# Altium footprint library Molex FFC - FPC Connectors (SMT).PcbLib: 638 footprints (part 5 of 40)
Each footprint in its own frame and in the unit in brackets; x right, y up, seen from the top. Pads: shape width x height; smd on the part's side, far side on the other; paste and mask are expansions set on the pad; w line width, h text height; cw(c..) or ccw(c..) is an arc to the next point about the centre after c.
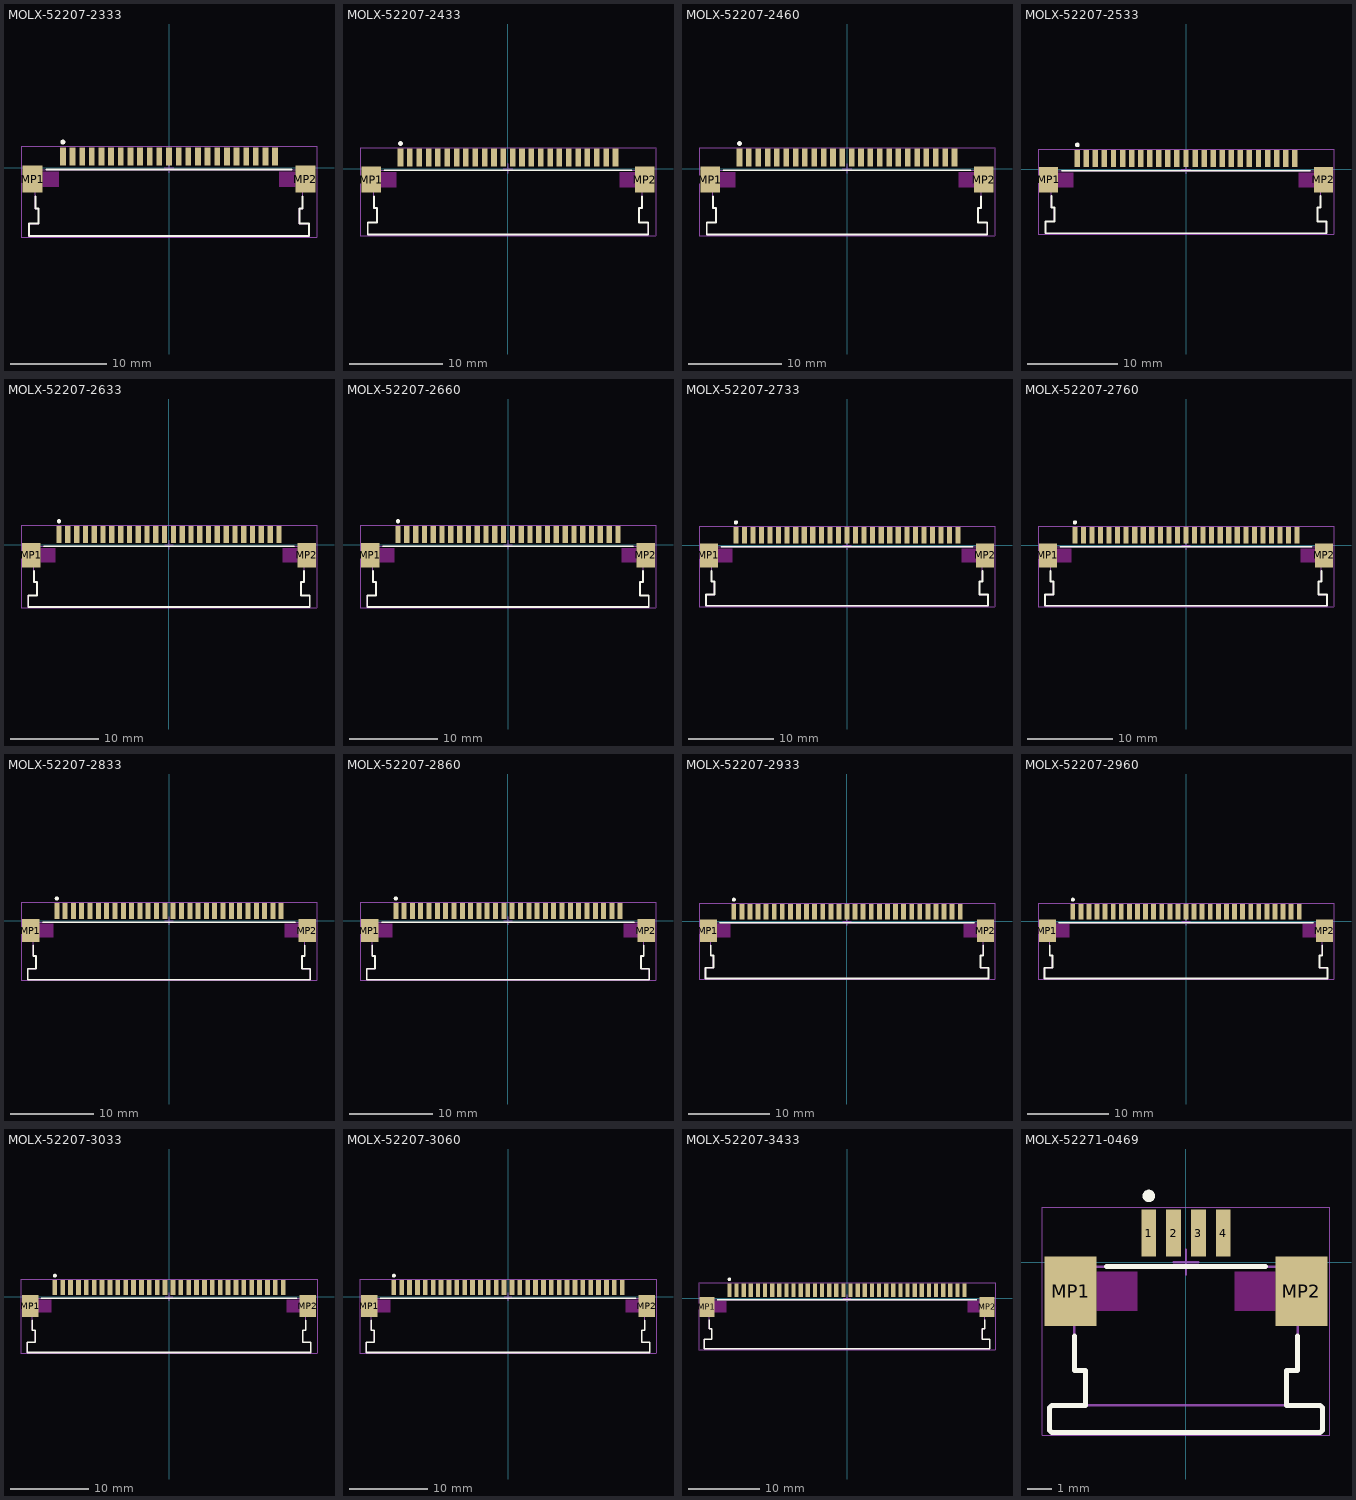
[diagram p4: the footprints below, top view; thin cyan lines are the x and y axes]

## MOLX-52207-2333 [mm] "FPC Connector, 23-Leads, Right Angle, Pitch 1.0 mm, Mated Height 2.7 mm, SMT"
height 2.712
pads (25):
  rect 0.6x1.9 smd: 1(-11,1.175) 2(-10,1.175) 3(-9,1.175) 4(-8,1.175) 5(-7,1.175) 6(-6,1.175) 7(-5,1.175) 8(-4,1.175) 9(-3,1.175) 10(-2,1.175) 11(-1,1.175) 12(0,1.175) 13(1,1.175) 14(2,1.175) 15(3,1.175) 16(4,1.175) 17(5,1.175) 18(6,1.175) 19(7,1.175) 20(8,1.175) 21(9,1.175) 22(10,1.175) 23(11,1.175)
  rect 2.1x2.8 smd: MP1(-14.15,-1.175) MP2(14.15,-1.175)
Top Overlay:
  circle w0.25: c-11,2.675 r0.125
  lines w0.2: -13.85,-2.975 -13.85,-4.225 -13.513,-4.225 -13.512,-5.765 -14.5,-5.765 -14.5,-7.075 14.5,-7.075 14.5,-5.765 13.512,-5.765 13.512,-4.225 13.85,-4.225 13.85,-2.975 ; -12.7,-0.175 12.7,-0.175
Keep-Out Layer:
  region: -13.1,-0.375 -11.45,-0.375 -11.45,-1.975 -13.1,-1.975
  region: 13.1,-0.375 11.45,-0.375 11.45,-1.975 13.1,-1.975
Mechanical 13:
  lines w0.1: -13.85,-2.175 -14.65,-2.175 -14.65,-0.175 14.65,-0.175 14.65,-2.175 13.85,-2.175 ; -13.85,-2.175 -13.85,-4.225 -13.512,-4.225 -13.512,-5.765 -14.5,-5.765 -14.5,-7.075 14.5,-7.075 14.5,-5.765 13.512,-5.765 13.512,-4.225 13.85,-4.225 13.85,-2.175
Mechanical 15:
  lines w0.05: -15.3,-7.175 -15.3,2.225 15.3,2.225 15.3,-7.175 -15.3,-7.175
  lines w0.1: -0.5,0 0.5,0 ; 0,-0.5 0,0.5
3D body: height 0.25, standoff 0, extent -14.65,-7.075 14.65,1.825

## MOLX-52207-2433 [mm] "FPC Connector, 24-Leads, Right Angle, Pitch 1.0 mm, Mated Height 2.7 mm, SMT"
height 2.712
pads (26):
  rect 0.6x1.9 smd: 1(-11.5,1.175) 2(-10.5,1.175) 3(-9.5,1.175) 4(-8.5,1.175) 5(-7.5,1.175) 6(-6.5,1.175) 7(-5.5,1.175) 8(-4.5,1.175) 9(-3.5,1.175) 10(-2.5,1.175) 11(-1.5,1.175) 12(-0.5,1.175) 13(0.5,1.175) 14(1.5,1.175) 15(2.5,1.175) 16(3.5,1.175) 17(4.5,1.175) 18(5.5,1.175) 19(6.5,1.175) 20(7.5,1.175) 21(8.5,1.175) 22(9.5,1.175) 23(10.5,1.175) 24(11.5,1.175)
  rect 2.1x2.8 smd: MP1(-14.65,-1.175) MP2(14.65,-1.175)
Top Overlay:
  circle w0.25: c-11.5,2.675 r0.125
  lines w0.2: -14.35,-2.975 -14.35,-4.225 -14.012,-4.225 -14.012,-5.765 -15,-5.765 -15,-7.075 15,-7.075 15,-5.765 14.012,-5.765 14.012,-4.225 14.35,-4.225 14.35,-2.975 ; -13.2,-0.175 13.2,-0.175
Keep-Out Layer:
  region: 13.6,-0.375 11.95,-0.375 11.95,-1.975 13.6,-1.975
  region: -13.6,-0.375 -11.95,-0.375 -11.95,-1.975 -13.6,-1.975
Mechanical 13:
  lines w0.1: -15.15,-2.175 -14.35,-2.175 -14.35,-4.225 -14.012,-4.225 -14.012,-5.765 -15,-5.765 -15,-7.075 15,-7.075 15,-5.765 14.012,-5.765 14.012,-4.225 14.35,-4.225 14.35,-2.175 15.15,-2.175 15.15,-0.175 -15.15,-0.175 -15.15,-2.175
Mechanical 15:
  lines w0.05: -15.8,-7.175 15.8,-7.175 15.8,2.225 -15.8,2.225 -15.8,-7.175
  lines w0.1: -0.5,0 0.5,0 ; 0,-0.5 0,0.5
3D body: height 0.25, standoff 0, extent -15.15,-7.075 15.15,1.825

## MOLX-52207-2460 [mm] "FPC Connector, 24-Leads, Right Angle, Pitch 1.0 mm, Mated Height 2.7 mm, SMT"
height 2.712
pads (26):
  rect 0.6x1.9 smd: 1(-11.5,1.175) 2(-10.5,1.175) 3(-9.5,1.175) 4(-8.5,1.175) 5(-7.5,1.175) 6(-6.5,1.175) 7(-5.5,1.175) 8(-4.5,1.175) 9(-3.5,1.175) 10(-2.5,1.175) 11(-1.5,1.175) 12(-0.5,1.175) 13(0.5,1.175) 14(1.5,1.175) 15(2.5,1.175) 16(3.5,1.175) 17(4.5,1.175) 18(5.5,1.175) 19(6.5,1.175) 20(7.5,1.175) 21(8.5,1.175) 22(9.5,1.175) 23(10.5,1.175) 24(11.5,1.175)
  rect 2.1x2.8 smd: MP1(-14.65,-1.175) MP2(14.65,-1.175)
Top Overlay:
  circle w0.25: c-11.5,2.675 r0.125
  lines w0.2: -14.35,-2.975 -14.35,-4.225 -14.013,-4.225 ; -14.012,-4.225 -14.012,-5.765 -15,-5.765 -15,-7.075 15,-7.075 15,-5.765 14.012,-5.765 14.012,-4.225 ; -13.2,-0.175 13.2,-0.175 ; 14.013,-4.225 14.35,-4.225 14.35,-2.975
Keep-Out Layer:
  region: 13.6,-0.375 11.95,-0.375 11.95,-1.975 13.6,-1.975
  region: -13.6,-0.375 -11.95,-0.375 -11.95,-1.975 -13.6,-1.975
Mechanical 13:
  lines w0.1: -15.15,-2.175 -14.35,-2.175 -14.35,-4.225 -14.012,-4.225 -14.012,-5.765 -15,-5.765 -15,-7.075 15,-7.075 15,-5.765 14.012,-5.765 14.012,-4.225 14.35,-4.225 14.35,-2.175 15.15,-2.175 15.15,-0.175 -15.15,-0.175 -15.15,-2.175
Mechanical 15:
  lines w0.05: -15.8,-7.175 15.8,-7.175 15.8,2.225 -15.8,2.225 -15.8,-7.175
  lines w0.1: -0.5,0 0.5,0 ; 0,-0.5 0,0.5
3D body: height 0.25, standoff 0, extent -15.15,-7.075 15.15,1.825

## MOLX-52207-2533 [mm] "FPC Connector, 25-Leads, Right Angle, Pitch 1.0 mm, Mated Height 2.7 mm, SMT"
height 2.712
pads (27):
  rect 0.6x1.9 smd: 1(-12,1.175) 2(-11,1.175) 3(-10,1.175) 4(-9,1.175) 5(-8,1.175) 6(-7,1.175) 7(-6,1.175) 8(-5,1.175) 9(-4,1.175) 10(-3,1.175) 11(-2,1.175) 12(-1,1.175) 13(0,1.175) 14(1,1.175) 15(2,1.175) 16(3,1.175) 17(4,1.175) 18(5,1.175) 19(6,1.175) 20(7,1.175) 21(8,1.175) 22(9,1.175) 23(10,1.175) 24(11,1.175) 25(12,1.175)
  rect 2.1x2.8 smd: MP1(-15.15,-1.175) MP2(15.15,-1.175)
Top Overlay:
  circle w0.25: c-12,2.675 r0.125
  lines w0.2: -14.85,-2.975 -14.85,-4.225 -14.512,-4.225 -14.512,-5.765 -15.5,-5.765 -15.5,-7.075 15.5,-7.075 15.5,-5.765 14.512,-5.765 14.512,-4.225 14.85,-4.225 14.85,-2.975 ; -13.7,-0.175 13.7,-0.175
Keep-Out Layer:
  region: 14.1,-0.375 12.45,-0.375 12.45,-1.975 14.1,-1.975
  region: -14.1,-0.375 -12.45,-0.375 -12.45,-1.975 -14.1,-1.975
Mechanical 13:
  lines w0.1: -15.65,-2.175 -14.85,-2.175 -14.85,-4.225 -14.512,-4.225 -14.512,-5.765 -15.5,-5.765 -15.5,-7.075 15.5,-7.075 15.5,-5.765 14.512,-5.765 14.512,-4.225 14.85,-4.225 14.85,-2.175 15.65,-2.175 15.65,-0.175 -15.65,-0.175 -15.65,-2.175
Mechanical 15:
  lines w0.05: -16.3,-7.175 16.3,-7.175 16.3,2.225 -16.3,2.225 -16.3,-7.175
  lines w0.1: -0.5,0 0.5,0 ; 0,-0.5 0,0.5
3D body: height 0.25, standoff 0, extent -15.65,-7.075 15.65,1.825

## MOLX-52207-2633 [mm] "FPC Connector, 26-Leads, Right Angle, Pitch 1.0 mm, Mated Height 2.7 mm, SMT"
height 2.712
pads (28):
  rect 0.6x1.9 smd: 1(-12.5,1.175) 2(-11.5,1.175) 3(-10.5,1.175) 4(-9.5,1.175) 5(-8.5,1.175) 6(-7.5,1.175) 7(-6.5,1.175) 8(-5.5,1.175) 9(-4.5,1.175) 10(-3.5,1.175) 11(-2.5,1.175) 12(-1.5,1.175) 13(-0.5,1.175) 14(0.5,1.175) 15(1.5,1.175) 16(2.5,1.175) 17(3.5,1.175) 18(4.5,1.175) 19(5.5,1.175) 20(6.5,1.175) 21(7.5,1.175) 22(8.5,1.175) 23(9.5,1.175) 24(10.5,1.175) 25(11.5,1.175) 26(12.5,1.175)
  rect 2.1x2.8 smd: MP1(-15.65,-1.175) MP2(15.65,-1.175)
Top Overlay:
  circle w0.25: c-12.5,2.675 r0.125
  lines w0.2: -15.35,-2.975 -15.35,-4.225 -15.012,-4.225 ; -15.012,-4.225 -15.012,-5.765 -16,-5.765 -16,-7.075 16,-7.075 16,-5.765 15.012,-5.765 15.012,-4.225 ; -14.2,-0.175 14.2,-0.175 ; 15.012,-4.225 15.35,-4.225 15.35,-2.975
Keep-Out Layer:
  region: 14.6,-0.375 12.95,-0.375 12.95,-1.975 14.6,-1.975
  region: -14.6,-0.375 -12.95,-0.375 -12.95,-1.975 -14.6,-1.975
Mechanical 13:
  lines w0.1: -16.15,-2.175 -15.35,-2.175 -15.35,-4.225 -15.012,-4.225 -15.012,-5.765 -16,-5.765 -16,-7.075 16,-7.075 16,-5.765 15.012,-5.765 15.012,-4.225 15.35,-4.225 15.35,-2.175 16.15,-2.175 16.15,-0.175 -16.15,-0.175 -16.15,-2.175
Mechanical 15:
  lines w0.05: -16.8,-7.175 16.8,-7.175 16.8,2.225 -16.8,2.225 -16.8,-7.175
  lines w0.1: -0.5,0 0.5,0 ; 0,-0.5 0,0.5
3D body: height 0.25, standoff 0, extent -16.15,-7.075 16.15,1.825

## MOLX-52207-2660 [mm] "FPC Connector, 26-Leads, Right Angle, Pitch 1.0 mm, Mated Height 2.7 mm, SMT"
height 2.712
pads (28):
  rect 0.6x1.9 smd: 1(-12.5,1.175) 2(-11.5,1.175) 3(-10.5,1.175) 4(-9.5,1.175) 5(-8.5,1.175) 6(-7.5,1.175) 7(-6.5,1.175) 8(-5.5,1.175) 9(-4.5,1.175) 10(-3.5,1.175) 11(-2.5,1.175) 12(-1.5,1.175) 13(-0.5,1.175) 14(0.5,1.175) 15(1.5,1.175) 16(2.5,1.175) 17(3.5,1.175) 18(4.5,1.175) 19(5.5,1.175) 20(6.5,1.175) 21(7.5,1.175) 22(8.5,1.175) 23(9.5,1.175) 24(10.5,1.175) 25(11.5,1.175) 26(12.5,1.175)
  rect 2.1x2.8 smd: MP1(-15.65,-1.175) MP2(15.65,-1.175)
Top Overlay:
  circle w0.25: c-12.5,2.675 r0.125
  lines w0.2: -15.35,-2.975 -15.35,-4.225 -15.013,-4.225 -15.012,-5.765 -16,-5.765 -16,-7.075 16,-7.075 16,-5.765 15.012,-5.765 15.012,-4.225 15.35,-4.225 15.35,-2.975 ; -14.2,-0.175 14.2,-0.175
Keep-Out Layer:
  region: 14.6,-0.375 12.95,-0.375 12.95,-1.975 14.6,-1.975
  region: -14.6,-0.375 -12.95,-0.375 -12.95,-1.975 -14.6,-1.975
Mechanical 13:
  lines w0.1: -16.15,-2.175 -15.35,-2.175 -15.35,-4.225 -15.012,-4.225 -15.012,-5.765 -16,-5.765 -16,-7.075 16,-7.075 16,-5.765 15.012,-5.765 15.012,-4.225 15.35,-4.225 15.35,-2.175 16.15,-2.175 16.15,-0.175 -16.15,-0.175 -16.15,-2.175
Mechanical 15:
  lines w0.05: -16.8,-7.175 16.8,-7.175 16.8,2.225 -16.8,2.225 -16.8,-7.175
  lines w0.1: -0.5,0 0.5,0 ; 0,-0.5 0,0.5
3D body: height 0.25, standoff 0, extent -16.15,-7.075 16.15,1.825

## MOLX-52207-2733 [mm] "FPC Connector, 27-Leads, Right Angle, Pitch 1.0 mm, Mated Height 2.7 mm, SMT"
height 2.712
pads (29):
  rect 0.6x1.9 smd: 1(-13,1.175) 2(-12,1.175) 3(-11,1.175) 4(-10,1.175) 5(-9,1.175) 6(-8,1.175) 7(-7,1.175) 8(-6,1.175) 9(-5,1.175) 10(-4,1.175) 11(-3,1.175) 12(-2,1.175) 13(-1,1.175) 14(0,1.175) 15(1,1.175) 16(2,1.175) 17(3,1.175) 18(4,1.175) 19(5,1.175) 20(6,1.175) 21(7,1.175) 22(8,1.175) 23(9,1.175) 24(10,1.175) 25(11,1.175) 26(12,1.175) 27(13,1.175)
  rect 2.1x2.8 smd: MP1(-16.15,-1.175) MP2(16.15,-1.175)
Top Overlay:
  circle w0.25: c-13,2.675 r0.125
  lines w0.2: -15.85,-2.975 -15.85,-4.225 -15.513,-4.225 ; -15.512,-4.225 -15.512,-5.765 -16.5,-5.765 -16.5,-7.075 16.5,-7.075 16.5,-5.765 15.512,-5.765 15.512,-4.225 ; -14.7,-0.175 14.7,-0.175 ; 15.513,-4.225 15.85,-4.225 15.85,-2.975
Keep-Out Layer:
  region: -15.1,-0.375 -13.45,-0.375 -13.45,-1.975 -15.1,-1.975
  region: 15.1,-0.375 13.45,-0.375 13.45,-1.975 15.1,-1.975
Mechanical 13:
  lines w0.1: -15.512,-4.225 -15.85,-4.225 -15.85,-2.175 -16.65,-2.175 -16.65,-0.175 16.65,-0.175 16.65,-2.175 15.85,-2.175 15.85,-4.225 15.512,-4.225 ; -15.512,-4.225 -15.512,-5.765 -16.5,-5.765 -16.5,-7.075 16.5,-7.075 16.5,-5.765 15.512,-5.765 15.512,-4.225
Mechanical 15:
  lines w0.05: -17.3,-7.175 -17.3,2.225 17.3,2.225 17.3,-7.175 -17.3,-7.175
  lines w0.1: -0.5,0 0.5,0 ; 0,-0.5 0,0.5
3D body: height 0.25, standoff 0, extent -16.65,-7.075 16.65,1.825

## MOLX-52207-2760 [mm] "FPC Connector, 27-Leads, Right Angle, Pitch 1.0 mm, Mated Height 2.7 mm, SMT"
height 2.712
pads (29):
  rect 0.6x1.9 smd: 1(-13,1.175) 2(-12,1.175) 3(-11,1.175) 4(-10,1.175) 5(-9,1.175) 6(-8,1.175) 7(-7,1.175) 8(-6,1.175) 9(-5,1.175) 10(-4,1.175) 11(-3,1.175) 12(-2,1.175) 13(-1,1.175) 14(0,1.175) 15(1,1.175) 16(2,1.175) 17(3,1.175) 18(4,1.175) 19(5,1.175) 20(6,1.175) 21(7,1.175) 22(8,1.175) 23(9,1.175) 24(10,1.175) 25(11,1.175) 26(12,1.175) 27(13,1.175)
  rect 2.1x2.8 smd: MP1(-16.15,-1.175) MP2(16.15,-1.175)
Top Overlay:
  circle w0.25: c-13,2.675 r0.125
  lines w0.2: -15.85,-2.975 -15.85,-4.225 -15.513,-4.225 ; -15.512,-4.225 -15.512,-5.765 -16.5,-5.765 -16.5,-7.075 16.5,-7.075 16.5,-5.765 15.512,-5.765 15.512,-4.225 ; -14.7,-0.175 14.7,-0.175 ; 15.513,-4.225 15.85,-4.225 15.85,-2.975
Keep-Out Layer:
  region: 15.1,-0.375 13.45,-0.375 13.45,-1.975 15.1,-1.975
  region: -15.1,-0.375 -13.45,-0.375 -13.45,-1.975 -15.1,-1.975
Mechanical 13:
  lines w0.1: -15.512,-4.225 -15.85,-4.225 -15.85,-2.175 -16.65,-2.175 -16.65,-0.175 16.65,-0.175 16.65,-2.175 15.85,-2.175 15.85,-4.225 15.512,-4.225 ; -15.512,-4.225 -15.512,-5.765 -16.5,-5.765 -16.5,-7.075 16.5,-7.075 16.5,-5.765 15.512,-5.765 15.512,-4.225
Mechanical 15:
  lines w0.05: -17.3,-7.175 17.3,-7.175 17.3,2.225 -17.3,2.225 -17.3,-7.175
  lines w0.1: -0.5,0 0.5,0 ; 0,-0.5 0,0.5
3D body: height 0.25, standoff 0, extent -16.65,-7.075 16.65,1.825

## MOLX-52207-2833 [mm] "FPC Connector, 28-Leads, Right Angle, Pitch 1.0 mm, Mated Height 2.7 mm, SMT"
height 2.712
pads (30):
  rect 0.6x1.9 smd: 1(-13.5,1.175) 2(-12.5,1.175) 3(-11.5,1.175) 4(-10.5,1.175) 5(-9.5,1.175) 6(-8.5,1.175) 7(-7.5,1.175) 8(-6.5,1.175) 9(-5.5,1.175) 10(-4.5,1.175) 11(-3.5,1.175) 12(-2.5,1.175) 13(-1.5,1.175) 14(-0.5,1.175) 15(0.5,1.175) 16(1.5,1.175) 17(2.5,1.175) 18(3.5,1.175) 19(4.5,1.175) 20(5.5,1.175) 21(6.5,1.175) 22(7.5,1.175) 23(8.5,1.175) 24(9.5,1.175) 25(10.5,1.175) 26(11.5,1.175) 27(12.5,1.175) 28(13.5,1.175)
  rect 2.1x2.8 smd: MP1(-16.65,-1.175) MP2(16.65,-1.175)
Top Overlay:
  circle w0.25: c-13.5,2.675 r0.125
  lines w0.2: -16.35,-2.975 -16.35,-4.225 -16.013,-4.225 -16.012,-5.765 -17,-5.765 -17,-7.075 17,-7.075 17,-5.765 16.012,-5.765 16.012,-4.225 16.35,-4.225 16.35,-2.975 ; -15.2,-0.175 15.2,-0.175
Keep-Out Layer:
  region: -15.6,-0.375 -13.95,-0.375 -13.95,-1.975 -15.6,-1.975
  region: 15.6,-0.375 13.95,-0.375 13.95,-1.975 15.6,-1.975
Mechanical 13:
  lines w0.1: -17.15,-2.175 -17.15,-0.175 17.15,-0.175 17.15,-2.175 16.35,-2.175 16.35,-4.225 16.012,-4.225 16.012,-5.765 17,-5.765 17,-7.075 -17,-7.075 -17,-5.765 -16.012,-5.765 -16.012,-4.225 -16.35,-4.225 -16.35,-2.175 -17.15,-2.175
Mechanical 15:
  lines w0.05: -17.8,-7.175 -17.8,2.225 17.8,2.225 17.8,-7.175 -17.8,-7.175
  lines w0.1: -0.5,0 0.5,0 ; 0,-0.5 0,0.5
3D body: height 0.25, standoff 0, extent -17.15,-7.075 17.15,1.825

## MOLX-52207-2860 [mm] "FPC Connector, 28-Leads, Right Angle, Pitch 1.0 mm, Mated Height 2.7 mm, SMT"
height 2.712
pads (30):
  rect 0.6x1.9 smd: 1(-13.5,1.175) 2(-12.5,1.175) 3(-11.5,1.175) 4(-10.5,1.175) 5(-9.5,1.175) 6(-8.5,1.175) 7(-7.5,1.175) 8(-6.5,1.175) 9(-5.5,1.175) 10(-4.5,1.175) 11(-3.5,1.175) 12(-2.5,1.175) 13(-1.5,1.175) 14(-0.5,1.175) 15(0.5,1.175) 16(1.5,1.175) 17(2.5,1.175) 18(3.5,1.175) 19(4.5,1.175) 20(5.5,1.175) 21(6.5,1.175) 22(7.5,1.175) 23(8.5,1.175) 24(9.5,1.175) 25(10.5,1.175) 26(11.5,1.175) 27(12.5,1.175) 28(13.5,1.175)
  rect 2.1x2.8 smd: MP1(-16.65,-1.175) MP2(16.65,-1.175)
Top Overlay:
  circle w0.25: c-13.5,2.675 r0.125
  lines w0.2: -16.35,-2.975 -16.35,-4.225 -16.012,-4.225 -16.012,-5.765 -17,-5.765 -17,-7.075 17,-7.075 17,-5.765 16.012,-5.765 16.012,-4.225 16.35,-4.225 16.35,-2.975 ; -15.2,-0.175 15.2,-0.175
Keep-Out Layer:
  region: 15.6,-0.375 13.95,-0.375 13.95,-1.975 15.6,-1.975
  region: -15.6,-0.375 -13.95,-0.375 -13.95,-1.975 -15.6,-1.975
Mechanical 13:
  lines w0.1: -17.15,-2.175 -16.35,-2.175 -16.35,-4.225 -16.012,-4.225 -16.012,-5.765 -17,-5.765 -17,-7.075 17,-7.075 17,-5.765 16.012,-5.765 16.012,-4.225 16.35,-4.225 16.35,-2.175 17.15,-2.175 17.15,-0.175 -17.15,-0.175 -17.15,-2.175
Mechanical 15:
  lines w0.05: -17.8,-7.175 17.8,-7.175 17.8,2.225 -17.8,2.225 -17.8,-7.175
  lines w0.1: -0.5,0 0.5,0 ; 0,-0.5 0,0.5
3D body: height 0.25, standoff 0, extent -17.15,-7.075 17.15,1.825

## MOLX-52207-2933 [mm] "FPC Connector, 29-Leads, Right Angle, Pitch 1.0 mm, Mated Height 2.7 mm, SMT"
height 2.712
pads (31):
  rect 0.6x1.9 smd: 1(-14,1.175) 2(-13,1.175) 3(-12,1.175) 4(-11,1.175) 5(-10,1.175) 6(-9,1.175) 7(-8,1.175) 8(-7,1.175) 9(-6,1.175) 10(-5,1.175) 11(-4,1.175) 12(-3,1.175) 13(-2,1.175) 14(-1,1.175) 15(0,1.175) 16(1,1.175) 17(2,1.175) 18(3,1.175) 19(4,1.175) 20(5,1.175) 21(6,1.175) 22(7,1.175) 23(8,1.175) 24(9,1.175) 25(10,1.175) 26(11,1.175) 27(12,1.175) 28(13,1.175) 29(14,1.175)
  rect 2.1x2.8 smd: MP1(-17.15,-1.175) MP2(17.15,-1.175)
Top Overlay:
  circle w0.25: c-14,2.675 r0.125
  lines w0.2: -16.85,-2.975 -16.85,-4.225 -16.512,-4.225 -16.512,-5.765 -17.5,-5.765 -17.5,-7.075 17.5,-7.075 17.5,-5.765 16.512,-5.765 16.512,-4.225 16.85,-4.225 16.85,-2.975 ; -15.7,-0.175 15.7,-0.175
Keep-Out Layer:
  region: -16.1,-0.375 -14.45,-0.375 -14.45,-1.975 -16.1,-1.975
  region: 16.1,-0.375 14.45,-0.375 14.45,-1.975 16.1,-1.975
Mechanical 13:
  lines w0.1: -17.5,-5.765 -16.512,-5.765 -16.512,-4.225 -16.85,-4.225 -16.85,-2.175 -17.65,-2.175 -17.65,-0.175 17.65,-0.175 17.65,-2.175 16.85,-2.175 16.85,-4.225 16.512,-4.225 16.512,-5.765 17.5,-5.765 17.5,-7.075 -17.5,-7.075 -17.5,-5.765
Mechanical 15:
  lines w0.05: -18.3,-7.175 -18.3,2.225 18.3,2.225 18.3,-7.175 -18.3,-7.175
  lines w0.1: -0.5,0 0.5,0 ; 0,-0.5 0,0.5
3D body: height 0.25, standoff 0, extent -17.65,-7.075 17.65,1.825

## MOLX-52207-2960 [mm] "FPC Connector, 29-Leads, Right Angle, Pitch 1.0 mm, Mated Height 2.7 mm, SMT"
height 2.712
pads (31):
  rect 0.6x1.9 smd: 1(-14,1.175) 2(-13,1.175) 3(-12,1.175) 4(-11,1.175) 5(-10,1.175) 6(-9,1.175) 7(-8,1.175) 8(-7,1.175) 9(-6,1.175) 10(-5,1.175) 11(-4,1.175) 12(-3,1.175) 13(-2,1.175) 14(-1,1.175) 15(0,1.175) 16(1,1.175) 17(2,1.175) 18(3,1.175) 19(4,1.175) 20(5,1.175) 21(6,1.175) 22(7,1.175) 23(8,1.175) 24(9,1.175) 25(10,1.175) 26(11,1.175) 27(12,1.175) 28(13,1.175) 29(14,1.175)
  rect 2.1x2.8 smd: MP1(-17.15,-1.175) MP2(17.15,-1.175)
Top Overlay:
  circle w0.25: c-14,2.675 r0.125
  lines w0.2: -16.85,-2.975 -16.85,-4.225 -16.512,-4.225 -16.512,-5.765 -17.5,-5.765 -17.5,-7.075 17.5,-7.075 17.5,-5.765 16.512,-5.765 16.512,-4.225 16.85,-4.225 16.85,-2.975 ; -15.7,-0.175 15.7,-0.175
Keep-Out Layer:
  region: 16.1,-0.375 14.45,-0.375 14.45,-1.975 16.1,-1.975
  region: -16.1,-0.375 -14.45,-0.375 -14.45,-1.975 -16.1,-1.975
Mechanical 13:
  lines w0.1: -17.5,-5.765 -16.512,-5.765 -16.512,-4.225 -16.85,-4.225 -16.85,-2.175 -17.65,-2.175 -17.65,-0.175 17.65,-0.175 17.65,-2.175 16.85,-2.175 16.85,-4.225 16.512,-4.225 16.512,-5.765 17.5,-5.765 ; -17.5,-5.765 -17.5,-7.075 17.5,-7.075 17.5,-5.765
Mechanical 15:
  lines w0.05: -18.3,-7.175 18.3,-7.175 18.3,2.225 -18.3,2.225 -18.3,-7.175
  lines w0.1: -0.5,0 0.5,0 ; 0,-0.5 0,0.5
3D body: height 0.25, standoff 0, extent -17.65,-7.075 17.65,1.825

## MOLX-52207-3033 [mm] "FPC Connector, 30-Leads, Right Angle, Pitch 1.0 mm, Mated Height 2.7 mm, SMT"
height 2.712
pads (32):
  rect 0.6x1.9 smd: 1(-14.5,1.175) 2(-13.5,1.175) 3(-12.5,1.175) 4(-11.5,1.175) 5(-10.5,1.175) 6(-9.5,1.175) 7(-8.5,1.175) 8(-7.5,1.175) 9(-6.5,1.175) 10(-5.5,1.175) 11(-4.5,1.175) 12(-3.5,1.175) 13(-2.5,1.175) 14(-1.5,1.175) 15(-0.5,1.175) 16(0.5,1.175) 17(1.5,1.175) 18(2.5,1.175) 19(3.5,1.175) 20(4.5,1.175) 21(5.5,1.175) 22(6.5,1.175) 23(7.5,1.175) 24(8.5,1.175) 25(9.5,1.175) 26(10.5,1.175) 27(11.5,1.175) 28(12.5,1.175) 29(13.5,1.175) 30(14.5,1.175)
  rect 2.1x2.8 smd: MP1(-17.65,-1.175) MP2(17.65,-1.175)
Top Overlay:
  circle w0.25: c-14.5,2.675 r0.125
  lines w0.2: -17.35,-2.975 -17.35,-4.225 -17.012,-4.225 ; -17.012,-4.225 -17.012,-5.765 -18,-5.765 -18,-7.075 18,-7.075 18,-5.765 17.012,-5.765 17.012,-4.225 ; -16.2,-0.175 16.2,-0.175 ; 17.012,-4.225 17.35,-4.225 17.35,-2.975
Keep-Out Layer:
  region: -16.6,-0.375 -14.95,-0.375 -14.95,-1.975 -16.6,-1.975
  region: 16.6,-0.375 14.95,-0.375 14.95,-1.975 16.6,-1.975
Mechanical 13:
  lines w0.1: -18.15,-2.175 -18.15,-0.175 18.15,-0.175 18.15,-2.175 17.35,-2.175 17.35,-4.225 17.012,-4.225 17.012,-5.765 18,-5.765 18,-7.075 -18,-7.075 -18,-5.765 -17.012,-5.765 -17.012,-4.225 -17.35,-4.225 -17.35,-2.175 -18.15,-2.175
Mechanical 15:
  lines w0.05: -18.8,-7.175 -18.8,2.225 18.8,2.225 18.8,-7.175 -18.8,-7.175
  lines w0.1: -0.5,0 0.5,0 ; 0,-0.5 0,0.5
3D body: height 0.25, standoff 0, extent -18.15,-7.075 18.15,1.825

## MOLX-52207-3060 [mm] "FPC Connector, 30-Leads, Right Angle, Pitch 1.0 mm, Mated Height 2.7 mm, SMT"
height 2.712
pads (32):
  rect 0.6x1.9 smd: 1(-14.5,1.175) 2(-13.5,1.175) 3(-12.5,1.175) 4(-11.5,1.175) 5(-10.5,1.175) 6(-9.5,1.175) 7(-8.5,1.175) 8(-7.5,1.175) 9(-6.5,1.175) 10(-5.5,1.175) 11(-4.5,1.175) 12(-3.5,1.175) 13(-2.5,1.175) 14(-1.5,1.175) 15(-0.5,1.175) 16(0.5,1.175) 17(1.5,1.175) 18(2.5,1.175) 19(3.5,1.175) 20(4.5,1.175) 21(5.5,1.175) 22(6.5,1.175) 23(7.5,1.175) 24(8.5,1.175) 25(9.5,1.175) 26(10.5,1.175) 27(11.5,1.175) 28(12.5,1.175) 29(13.5,1.175) 30(14.5,1.175)
  rect 2.1x2.8 smd: MP1(-17.65,-1.175) MP2(17.65,-1.175)
Top Overlay:
  circle w0.25: c-14.5,2.675 r0.125
  lines w0.2: -17.35,-2.975 -17.35,-4.225 -17.012,-4.225 ; -17.012,-4.225 -17.012,-5.765 -18,-5.765 -18,-7.075 18,-7.075 18,-5.765 17.012,-5.765 17.012,-4.225 ; -16.2,-0.175 16.2,-0.175 ; 17.012,-4.225 17.35,-4.225 17.35,-2.975
Keep-Out Layer:
  region: -16.6,-0.375 -14.95,-0.375 -14.95,-1.975 -16.6,-1.975
  region: 16.6,-0.375 14.95,-0.375 14.95,-1.975 16.6,-1.975
Mechanical 13:
  lines w0.1: -18.15,-2.175 -18.15,-0.175 18.15,-0.175 18.15,-2.175 17.35,-2.175 17.35,-4.225 17.012,-4.225 17.012,-5.765 18,-5.765 18,-7.075 -18,-7.075 -18,-5.765 -17.012,-5.765 -17.012,-4.225 -17.35,-4.225 -17.35,-2.175 -18.15,-2.175
Mechanical 15:
  lines w0.05: -18.8,-7.175 -18.8,2.225 18.8,2.225 18.8,-7.175 -18.8,-7.175
  lines w0.1: -0.5,0 0.5,0 ; 0,-0.5 0,0.5
3D body: height 0.25, standoff 0, extent -18.15,-7.075 18.15,1.825

## MOLX-52207-3433 [mm] "FPC Connector, 34-Leads, Right Angle, Pitch 1.0 mm, Mated Height 2.7 mm, SMT"
height 2.712
pads (36):
  rect 0.6x1.9 smd: 1(-16.5,1.175) 2(-15.5,1.175) 3(-14.5,1.175) 4(-13.5,1.175) 5(-12.5,1.175) 6(-11.5,1.175) 7(-10.5,1.175) 8(-9.5,1.175) 9(-8.5,1.175) 10(-7.5,1.175) 11(-6.5,1.175) 12(-5.5,1.175) 13(-4.5,1.175) 14(-3.5,1.175) 15(-2.5,1.175) 16(-1.5,1.175) 17(-0.5,1.175) 18(0.5,1.175) 19(1.5,1.175) 20(2.5,1.175) 21(3.5,1.175) 22(4.5,1.175) 23(5.5,1.175) 24(6.5,1.175) 25(7.5,1.175) 26(8.5,1.175) 27(9.5,1.175) 28(10.5,1.175) 29(11.5,1.175) 30(12.5,1.175) 31(13.5,1.175) 32(14.5,1.175) 33(15.5,1.175) 34(16.5,1.175)
  rect 2.1x2.8 smd: MP1(-19.65,-1.175) MP2(19.65,-1.175)
Top Overlay:
  circle w0.25: c-16.5,2.675 r0.125
  lines w0.2: -19.35,-2.975 -19.35,-4.225 -19.012,-4.225 -19.012,-5.765 -20,-5.765 -20,-7.075 20,-7.075 20,-5.765 19.012,-5.765 19.012,-4.225 19.35,-4.225 19.35,-2.975 ; -18.2,-0.175 18.2,-0.175
Keep-Out Layer:
  region: 18.6,-0.375 16.95,-0.375 16.95,-1.975 18.6,-1.975
  region: -18.6,-0.375 -16.95,-0.375 -16.95,-1.975 -18.6,-1.975
Mechanical 13:
  lines w0.1: -20.15,-2.175 -19.35,-2.175 -19.35,-4.225 -19.012,-4.225 -19.012,-5.765 -20,-5.765 -20,-7.075 20,-7.075 20,-5.765 19.012,-5.765 19.012,-4.225 19.35,-4.225 19.35,-2.175 20.15,-2.175 20.15,-0.175 -20.15,-0.175 -20.15,-2.175
Mechanical 15:
  lines w0.05: -20.8,-7.175 20.8,-7.175 20.8,2.225 -20.8,2.225 -20.8,-7.175
  lines w0.1: -0.5,0 0.5,0 ; 0,-0.5 0,0.5
3D body: height 0.25, standoff 0, extent -20.15,-7.075 20.15,1.825

## MOLX-52271-0469 [mm] "FPC Connector, 4-Leads, Right Angle, Pitch 1.0 mm, Mated Height 3.0 mm, SMT"
height 3
pads (6):
  rect 0.6x1.9 smd: 1(-1.5,1.175) 2(-0.5,1.175) 3(0.5,1.175) 4(1.5,1.175)
  rect 2.1x2.8 smd: MP1(-4.65,-1.175) MP2(4.65,-1.175)
Top Overlay:
  circle w0.25: c-1.5,2.675 r0.125
  lines w0.2: -4.5,-2.975 -4.5,-4.375 -4.05,-4.375 -4.05,-5.775 -5.412,-5.775 -5.5,-5.863 -5.5,-6.787 -5.412,-6.875 5.412,-6.875 5.5,-6.787 5.5,-5.863 5.412,-5.775 4.05,-5.775 4.05,-4.375 4.5,-4.375 4.5,-2.975 ; -3.2,-0.175 3.2,-0.175
Keep-Out Layer:
  rectangle: -3.6,-1.975 -1.95,-0.375
  rectangle: 1.95,-1.975 3.6,-0.375
Mechanical 13:
  lines w0.1: -5.5,-6.787 -5.5,-5.863 -5.412,-5.775 -4.05,-5.775 ; -5.5,-6.787 -5.5,-6.787 ; -5.5,-6.787 -5.412,-6.875 5.412,-6.875 5.5,-6.787 5.5,-5.863 5.412,-5.775 4.05,-5.775 ; -4.05,-5.775 -4.05,-4.375 -4.5,-4.375 -4.5,-0.175 4.5,-0.175 4.5,-4.375 4.05,-4.375 4.05,-5.775 ; -4.05,-5.775 4.05,-5.775
Mechanical 15:
  lines w0.05: -5.8,-6.975 5.8,-6.975 5.8,2.225 -5.8,2.225 -5.8,-6.975
  lines w0.1: -0.5,0 0.5,0 ; 0,-0.5 0,0.5
3D body: height 0.25, standoff 0, extent -5.5,-6.875 5.5,1.825